# Altium footprint library LJ_Mosfet_Power.PcbLib: 96 footprints (part 2 of 6)
Each footprint in its own frame and in the unit in brackets; x right, y up, seen from the top. Pads: shape width x height; smd on the part's side, far side on the other; paste and mask are expansions set on the pad; w line width, h text height; cw(c..) or ccw(c..) is an arc to the next point about the centre after c.
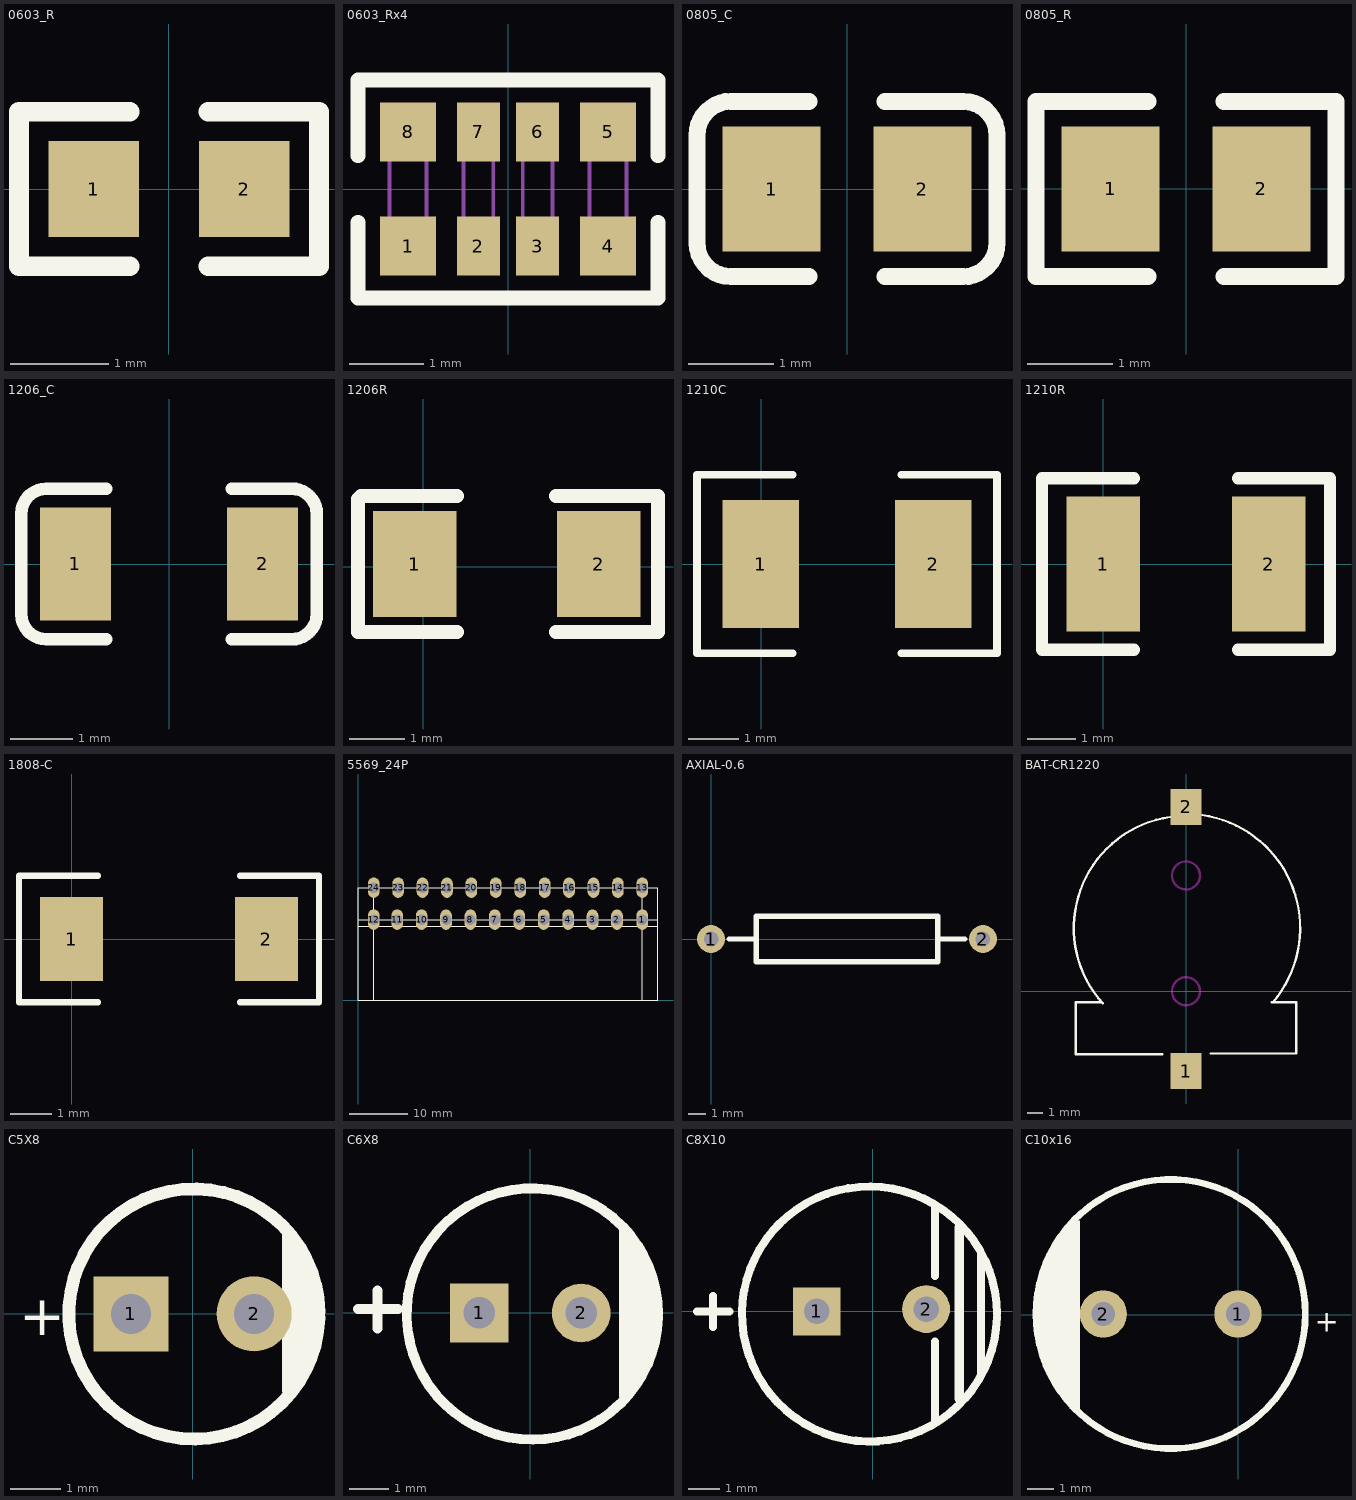
[diagram p1: the footprints below, top view; thin cyan lines are the x and y axes]

## 0603_R [mm]
pads (2):
  rect 0.93x0.98 smd: 1(-0.77,0) 2(0.77,0)
Top Overlay:
  lines w0.2: -0.4,-0.79 -1.535,-0.79 -1.535,0.79 -0.4,0.79 ; 0.4,-0.79 1.535,-0.79 1.535,0.79 0.4,0.79
3D body "User Library-RES_1609-0603.STEP": height 0.56, standoff 0, extent -0.85,-0.4 0.85,0.4

## 0603_Rx4 [mm]
pads (8):
  rect 0.75x0.8 smd mask+0.051: 1(-1.35,-0.77) 4(1.35,-0.77) 5(1.35,0.77) 8(-1.35,0.77)
  rect 0.58x0.8 smd mask+0.051: 2(-0.4,-0.77) 3(0.4,-0.77) 6(0.4,0.77) 7(-0.4,0.77)
Top Overlay:
  lines w0.2: -2.025,-0.45 -2.025,-1.47 2.025,-1.47 2.025,-0.45 ; -2.025,0.45 -2.025,1.47 2.025,1.47 2.025,0.45
Mechanical 13:
  lines w0.05: -1.6,-0.8 -1.1,-0.8 -1.1,0.8 -1.6,0.8 -1.6,-0.8 ; -0.6,-0.8 -0.2,-0.8 -0.2,0.8 -0.6,0.8 -0.6,-0.8 ; 0.2,-0.8 0.6,-0.8 0.6,0.8 0.2,0.8 0.2,-0.8 ; 1.1,-0.8 1.6,-0.8 1.6,0.8 1.1,0.8 1.1,-0.8
3D body "SW3dPS-RN164P.STEP": height 0.55, standoff 0, extent -1.6,-0.8 1.6,0.8

## 0805_C [mm]
pads (2):
  rect 1.16x1.47 smd: 1(-0.89,0) 2(0.89,0)
Top Overlay:
  lines w0.2: -0.45,-1.035 -1.37,-1.035 cw(c-1.37,-0.635) -1.77,-0.635 -1.77,0.635 cw(c-1.37,0.635) -1.37,1.035 -0.45,1.035 ; 0.45,-1.035 1.37,-1.035 ccw(c1.37,-0.635) 1.77,-0.635 1.77,0.635 ccw(c1.37,0.635) 1.37,1.035 0.45,1.035
3D body "User Library-0805 SMD Capacitor.STEP": height 0.77, standoff -0.01, extent -0.999,-0.625 1.001,0.625

## 0805_R [mm]
pads (2):
  rect 1.16x1.47 smd: 1(-0.89,0) 2(0.89,0)
Top Overlay:
  lines w0.2: -0.45,-1.035 -1.77,-1.035 -1.77,1.035 -0.45,1.035 ; 0.45,-1.035 1.77,-1.035 1.77,1.035 0.45,1.035
3D body "User Library-R_0805.STEP": height 0.49, standoff -0.01, extent -0.997,-0.625 1.003,0.625

## 1206_C [mm]
pads (2):
  rect 1.13x1.8 smd: 1(-1.49,0) 2(1.49,0)
Top Overlay:
  lines w0.2: -1,-1.2 -1.955,-1.2 cw(c-1.955,-0.8) -2.355,-0.8 -2.355,0.8 cw(c-1.955,0.8) -1.955,1.2 -1,1.2 ; 1,-1.2 1.955,-1.2 ccw(c1.955,-0.8) 2.355,-0.8 2.355,0.8 ccw(c1.955,0.8) 1.955,1.2 1,1.2
3D body "C1206.STEP": height 1, standoff 0, extent -1.602,-0.813 1.598,0.787

## 1206R [mil]
pads (2):
  rect 59.06x75 smd: 1(-6,2) 2(124,2)
Top Overlay:
  lines w10: 24,-46 -46,-46 -46,48 -44,50 24,50 ; 94,-46 166,-46 166,-2 166,50 94,50
3D body "User Library-RES_3216-1206.STEP": height 33.46, standoff 0, extent -7.94,-32 123.94,36.11

## 1210C [mil]
pads (2):
  rect 60x100 smd: 1(-0.2,0.32) 2(134.8,0.32)
Top Overlay:
  lines w5.91: 24.8,-69.68 -50.2,-69.68 -50.2,70.32 24.8,70.32 ; 109.8,-69.68 184.8,-69.68 184.8,70.32 109.8,70.32
3D body "User Library-cap_1210_lowprofile.step": height 51.18, standoff 0, extent 4.31,-48.9 130.29,49.53

## 1210R [mil]
pads (2):
  rect 60x110 smd: 1(0,0) 2(135,0)
Top Overlay:
  lines w10: 25,-70 -50,-70 -50,70 25,70 ; 110,-70 185,-70 185,70 110,70
3D body "User Library-res1210.STEP": height 24.79, standoff 0, extent -18.68,-52 146.68,54.3

## 1808-C [mil]
pads (2):
  rect 60x80 smd: 1(0,0) 2(185,0)
Top Overlay:
  lines w5.91: 25,-60 -50,-60 -50,60 25,60 ; 160,-60 235,-60 235,60 160,60
3D body "User Library-cap_1808_low.step": height 53.15, standoff 0, extent 1.95,-39.37 183.05,39.37

## 5569_24P [mm] "连接器 接插件5557-5569双排塑壳电脑延长线接线端子 弯针座"
height 0.254
pads (24):
  oval 2x3.5 hole 1.8: 1(48.9,13.9) 2(44.54,13.9) 3(40.34,13.9) 4(36.14,13.9) 5(31.94,13.9) 6(27.74,13.9) 7(23.54,13.9) 8(19.34,13.9) 9(15.14,13.9) 10(10.94,13.9) 11(6.74,13.9) 12(2.7,13.9) 13(48.9,19.4) 14(44.7,19.4) 15(40.5,19.4) 16(36.3,19.4) 17(32.1,19.4) 18(27.9,19.4) 19(23.7,19.4) 20(19.5,19.4) 21(15.3,19.4) 22(11.1,19.4) 23(6.9,19.4) 24(2.7,19.4)
Top Overlay:
  lines w0.127: 2.7,0 2.7,12.8 2.7,19.367 ; 4.826,0 51.6,0 51.6,12.8 ; 5.207,0 0,0 0,12.8 ; 48.9,0 48.9,12.8 48.9,19.299 ; 0,12.8 0,13.9 ; 0,12.8 51.6,12.8 ; 0,13.9 0,19.4 51.6,19.4 51.6,13.9 ; 0,13.9 51.6,13.9 ; 51.6,12.8 51.6,13.9

## AXIAL-0.6 [mil]
pads (2):
  round 62 hole 32: 1(0,0) 2(600,0)
Top Overlay:
  lines w12: 40,0 100,0 ; 500,0 560,0 ; 100,-50 100,50 500,50 500,-50 100,-50

## BAT-CR1220 [mm]
pads (2):
  rect 2x2.3 smd: 1(0,-5.138) 2(0,11.862)
Top Overlay:
  lines w0.15: -5.342,-0.793 cw(c0,4.064) -1.021,11.211 ; 1.039,11.335 cw(c0,4.064) 5.588,-0.702
  lines w0.152: -7.112,-4.064 -1.524,-4.064 ; -7.1,-4 -7.1,-0.702 -5.5,-0.702 ; 1.588,-4 7.1,-4 7.1,-0.702 ; 5.5,-0.702 7.112,-0.702
Keep-Out Layer:
  circle w0.15: c0,7.45 r0.9
  circle w0.15: c0,0 r0.9
3D body "User Library-cr1220.STEP": height 4.44, standoff -0.5, extent -7.631,-5.44 7.366,13.06

## C5X8 [mm] "RB.1/.2"
pads (2):
  rect 1.5x1.5 hole 0.8: 1(-1.231,0)
  round 1.5 hole 0.8: 2(1.231,0)
Top Overlay:
  lines w0.254: 2.526,-0.076 cw(c0.028,-0.004) 2.527,0.037
  lines w0.3: 1.942,-1.524 1.942,1.549
  lines w0.5: 2.196,-0.94 2.196,0.94
  text "+" at -3.468,-0.432 h0.8
3D body "C5x8.STEP": height 8.13, standoff -2.37, extent -2.499,-2.503 2.501,2.489

## C6X8 [mm]
pads (2):
  rect 1.5x1.5 hole 0.8: 1(-1.3,0)
  round 1.5 hole 0.8: 2(1.3,0)
Top Overlay:
  lines w0.254: -4.4,0.1 -3.384,0.1 ; -3.9,-0.4 -3.9,0.567 ; 2.388,-2.108 2.388,2.159 ; 3.261,-0.116 cw(c0.052,-0.028) 3.262,-0.025
  lines w0.3: 2.642,-1.88 2.642,1.778
  lines w0.5: 2.896,-1.245 2.896,1.168
3D body "6_3x7x2_5mm.STEP": height 7.53, standoff -3.01, extent -3.15,-3.201 3.201,3.15

## C8X10 [mm]
pads (2):
  rect 1.5x1.5 hole 0.8: 1(-1.753,-0.013)
  round 1.5 hole 0.8: 2(1.676,0.064)
Top Overlay:
  lines w0.254: -5.512,-0.013 -4.496,-0.013 ; -5.004,-0.495 -5.004,0.472 ; 1.956,-3.467 1.956,-0.953 ; 1.956,1.105 1.956,3.238 ; 3.404,-1.994 3.404,1.816 ; 3.898,-0.201 cw(c-0.1,-0.091) 3.9,-0.088
  lines w0.3: 2.718,-2.756 2.718,2.629
3D body "CAP 8X11_5.STEP": height 11.74, standoff -18.75, extent -4.102,-4 3.898,4

## C10x16 [mil] "RB.2/.4"
pads (2):
  round 70 hole 35: 1(0,1) 2(-200,1)
Top Overlay:
  circle w10: c-100,1 r200
  rectangle: -295.02,-60 -265.02,55
  rectangle: -285.02,-80 -260.02,90
  rectangle: -270.02,-110 -245.02,115
  rectangle: -250.02,-140 -235.02,140
  lines w11.81: -245,130 ccw(c-105.35,2.7) -241.45,-128.39
  text "+" at 114,-25 h31.5
3D body "Cap 10x16.STEP": height 708.66, standoff -669.29, extent -296.85,-197.7 96.85,196